# Altium footprint library lib_protel_HC_BOINA.PCBLIB: 726 footprints (part 26 of 46)
Each footprint in its own frame and in the unit in brackets; x right, y up, seen from the top. Pads: shape width x height; smd on the part's side, far side on the other; paste and mask are expansions set on the pad; w line width, h text height; cw(c..) or ccw(c..) is an arc to the next point about the centre after c.
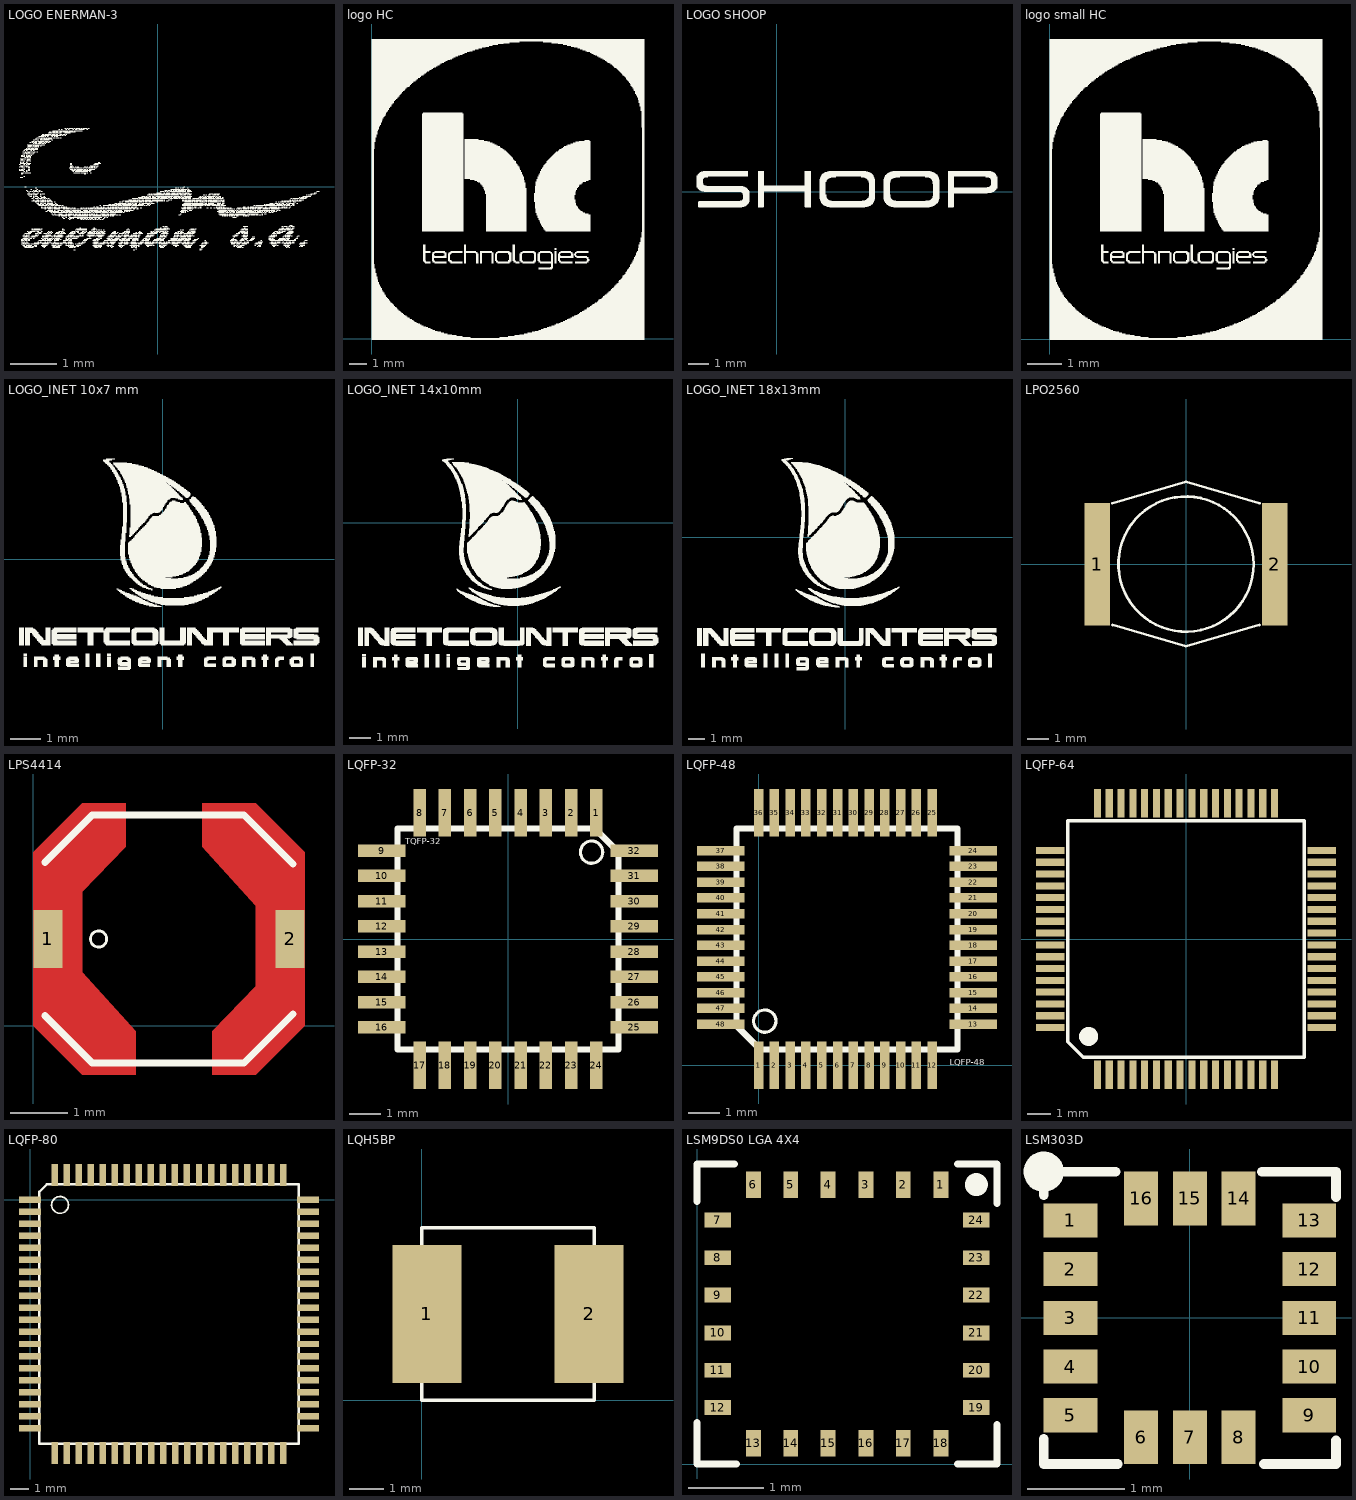
[diagram p25: the footprints below, top view; thin cyan lines are the x and y axes]

## LOGO ENERMAN-3 [mm]
Top Overlay:
  drawing of 1341 lines, arcs and shapes, not listed

## logo HC [mm] "logo de HC de 1,5x1,5mm aproximadamente"
Top Overlay:
  drawing of 1274 lines, arcs and shapes, not listed

## LOGO SHOOP [mm]
Top Overlay:
  drawing of 515 lines, arcs and shapes, not listed

## logo small HC [mm] "Logo de 7x7mm aproximadamente"
Top Overlay:
  drawing of 1274 lines, arcs and shapes, not listed

## LOGO_INET 10x7 mm [mm]
Top Overlay:
  drawing of 1271 lines, arcs and shapes, not listed

## LOGO_INET 14x10mm [mm]
Top Overlay:
  drawing of 1793 lines, arcs and shapes, not listed

## LOGO_INET 18x13mm [mm]
Top Overlay:
  drawing of 2284 lines, arcs and shapes, not listed

## LPO2560 [mm] "LPO2506 Series On board style"
height 1.65
pads (2):
  rect 1.21x5.84 smd: 1(-4.225,0) 2(4.225,0)
Top Overlay:
  circle w0.127: c0,0 r3.22
  lines w0.127: -3.506,2.895 0.001,3.915 3.501,2.905 ; -3.5,-2.9 -0.005,-3.909 3.5,-2.9

## LPS4414 [mm]
height 1.4
pads (2):
  rect 0.5x1 smd mask+0: 1(0.25,1.5) 2(4.45,1.5)
Top Layer:
  region: 0,0 0,3 0.85,3.85 1.6,3.85 1.6,3.1 0.85,2.32 0.85,0.92 1.77,-0.1 1.77,-0.85 0.85,-0.85
  region: 4.7,3 4.7,0 3.85,-0.85 3.1,-0.85 3.1,-0.1 3.85,0.68 3.85,2.08 2.93,3.1 2.93,3.85 3.85,3.85
Top Overlay:
  circle w0.051: c1.13,1.5 r0.14
  lines w0.127: 0.2,0.17 1.02,-0.65 3.65,-0.65 4.5,0.2 ; 0.2,2.83 1.02,3.65 3.65,3.65 4.5,2.8

## LQFP-32 [mm]
pads (32):
  rect 0.4x1.5 smd: 1(2.8,4) 2(2,4) 3(1.2,4) 4(0.4,4) 5(-0.4,4) 6(-1.2,4) 7(-2,4) 8(-2.8,4) 17(-2.8,-4) 18(-2,-4) 19(-1.2,-4) 20(-0.4,-4) 21(0.4,-4) 22(1.2,-4) 23(2,-4) 24(2.8,-4)
  rect 1.5x0.4 smd: 9(-4,2.8) 10(-4,2) 11(-4,1.2) 12(-4,0.4) 13(-4,-0.4) 14(-4,-1.2) 15(-4,-2) 16(-4,-2.8) 25(4,-2.8) 26(4,-2) 27(4,-1.2) 28(4,-0.4) 29(4,0.4) 30(4,1.2) 31(4,2) 32(4,2.8)
Top Overlay:
  circle w0.1: c2.646,2.75 r0.353
  lines w0.2: -3.5,-3.5 3.5,-3.5 3.5,2.75 2.75,3.5 -3.5,3.5 -3.5,-3.5
  text "TQFP-32" at -3.25,3 h0.2

## LQFP-48 [mm]
height 1.6
pads (48):
  rect 0.3x1.5 smd: 1(0,0) 2(0.5,0) 3(1,0) 4(1.5,0) 5(2,0) 6(2.5,0) 7(3,0) 8(3.5,0) 9(4,0) 10(4.5,0) 11(5,0) 12(5.5,0) 25(5.5,8) 26(5,8) 27(4.5,8) 28(4,8) 29(3.5,8) 30(3,8) 31(2.5,8) 32(2,8) 33(1.5,8) 34(1,8) 35(0.5,8) 36(0,8)
  rect 1.5x0.3 smd: 13(6.8,1.3) 14(6.8,1.8) 15(6.8,2.3) 16(6.8,2.8) 17(6.8,3.3) 18(6.8,3.8) 19(6.8,4.3) 20(6.8,4.8) 21(6.8,5.3) 22(6.8,5.8) 23(6.8,6.3) 24(6.8,6.8) 37(-1.2,6.8) 38(-1.2,6.3) 39(-1.2,5.8) 40(-1.2,5.3) 41(-1.2,4.8) 42(-1.2,4.3) 43(-1.2,3.8) 44(-1.2,3.3) 45(-1.2,2.8) 46(-1.2,2.3) 47(-1.2,1.8) 48(-1.2,1.3)
Top Overlay:
  circle w0.1: c0.196,1.4 r0.353
  lines w0.2: -0.7,1.25 0.05,0.5 6.3,0.5 6.3,7.5 -0.7,7.5 -0.7,1.25
  text "LQFP-48" at 6.05,0 h0.2
3D body "LQFP-48.stp": height 1.5, standoff 0, extent -1.75,-0.45 7.25,8.55

## LQFP-64 [mm]
pads (64):
  rect 0.3x1.2 smd: 1(-3.75,-5.75) 2(-3.25,-5.75) 3(-2.75,-5.75) 4(-2.25,-5.75) 5(-1.75,-5.75) 6(-1.25,-5.75) 7(-0.75,-5.75) 8(-0.25,-5.75) 9(0.25,-5.75) 10(0.75,-5.75) 11(1.25,-5.75) 12(1.75,-5.75) 13(2.25,-5.75) 14(2.75,-5.75) 15(3.25,-5.75) 16(3.75,-5.75) 33(3.75,5.75) 34(3.25,5.75) 35(2.75,5.75) 36(2.25,5.75) 37(1.75,5.75) 38(1.25,5.75) 39(0.75,5.75) 40(0.25,5.75) 41(-0.25,5.75) 42(-0.75,5.75) 43(-1.25,5.75) 44(-1.75,5.75) 45(-2.25,5.75) 46(-2.75,5.75) 47(-3.25,5.75) 48(-3.75,5.75)
  rect 1.2x0.3 smd: 17(5.75,-3.75) 18(5.75,-3.25) 19(5.75,-2.75) 20(5.75,-2.25) 21(5.75,-1.75) 22(5.75,-1.25) 23(5.75,-0.75) 24(5.75,-0.25) 25(5.75,0.25) 26(5.75,0.75) 27(5.75,1.25) 28(5.75,1.75) 29(5.75,2.25) 30(5.75,2.75) 31(5.75,3.25) 32(5.75,3.75) 49(-5.75,3.75) 50(-5.75,3.25) 51(-5.75,2.75) 52(-5.75,2.25) 53(-5.75,1.75) 54(-5.75,1.25) 55(-5.75,0.75) 56(-5.75,0.25) 57(-5.75,-0.25) 58(-5.75,-0.75) 59(-5.75,-1.25) 60(-5.75,-1.75) 61(-5.75,-2.25) 62(-5.75,-2.75) 63(-5.75,-3.25) 64(-5.75,-3.75)
Top Overlay:
  circle w0.4: c-4.125,-4.125 r0.202
  lines w0.15: -5,-4.35 -4.35,-5 5,-5 5,5 -5,5 -5,-4.35
3D body "LQFP-64-1.STEP": height 1.5, standoff 0, extent -4.975,-5.95 5.025,6.05

## LQFP-80 [mm]
height 1.6
pads (80):
  rect 1.2x0.35 smd: 1(0,0) 2(0,-0.65) 3(0,-1.3) 4(0,-1.95) 5(0,-2.6) 6(0,-3.25) 7(0,-3.9) 8(0,-4.55) 9(0,-5.2) 10(0,-5.85) 11(0,-6.5) 12(0,-7.15) 13(0,-7.8) 14(0,-8.45) 15(0,-9.1) 16(0,-9.75) 17(0,-10.4) 18(0,-11.05) 19(0,-11.7) 20(0,-12.35) 41(15,-12.35) 42(15,-11.7) 43(15,-11.05) 44(15,-10.4) 45(15,-9.75) 46(15,-9.1) 47(15,-8.45) 48(15,-7.8) 49(15,-7.15) 50(15,-6.5) 51(15,-5.85) 52(15,-5.2) 53(15,-4.55) 54(15,-3.9) 55(15,-3.25) 56(15,-2.6) 57(15,-1.95) 58(15,-1.3) 59(15,-0.65) 60(15,0)
  rect 0.35x1.2 smd: 21(1.33,-13.68) 22(1.98,-13.68) 23(2.63,-13.68) 24(3.28,-13.68) 25(3.93,-13.68) 26(4.58,-13.68) 27(5.23,-13.68) 28(5.88,-13.68) 29(6.53,-13.68) 30(7.18,-13.68) 31(7.83,-13.68) 32(8.48,-13.68) 33(9.13,-13.68) 34(9.78,-13.68) 35(10.43,-13.68) 36(11.08,-13.68) 37(11.73,-13.68) 38(12.38,-13.68) 39(13.03,-13.68) 40(13.68,-13.68) 61(13.67,1.32) 62(13.02,1.32) 63(12.37,1.32) 64(11.72,1.32) 65(11.07,1.32) 66(10.42,1.32) 67(9.77,1.32) 68(9.12,1.32) 69(8.47,1.32) 70(7.82,1.32) 71(7.17,1.32) 72(6.52,1.32) 73(5.87,1.32) 74(5.22,1.32) 75(4.57,1.32) 76(3.92,1.32) 77(3.27,1.32) 78(2.62,1.32) 79(1.97,1.32) 80(1.32,1.32)
Top Overlay:
  lines w0.1: 2.07,-0.29 cw(c1.617,-0.29) 2.07,-0.276
  lines w0.127: 0.5,-13.18 0.5,0.42 0.9,0.82 14.5,0.82 14.5,-13.18 0.5,-13.18

## LQH5BP [mm] "FERRITA NFC"
height 2
pads (2):
  rect 2x4 smd mask+0.05: 1(0.15,2.5) 2(4.85,2.5)
Top Overlay:
  lines w0.1: 0,0 0,5 5,5 5,0 0,0

## LSM9DS0 LGA 4X4 [mm] "LGA 4X4"
height 1
pads (24):
  rect 0.2x0.35 smd: 1(3.25,3.725) 2(2.75,3.725) 3(2.25,3.725) 4(1.75,3.725) 5(1.25,3.725) 6(0.75,3.725) 13(0.75,0.275) 14(1.25,0.275) 15(1.75,0.275) 16(2.25,0.275) 17(2.75,0.275) 18(3.25,0.275)
  rect 0.35x0.2 smd: 7(0.275,3.25) 8(0.275,2.75) 9(0.275,2.25) 10(0.275,1.75) 11(0.275,1.25) 12(0.275,0.75) 19(3.725,0.75) 20(3.725,1.25) 21(3.725,1.75) 22(3.725,2.25) 23(3.725,2.75) 24(3.725,3.25)
Top Overlay:
  circle w0.254: c3.725,3.725 r0.025
  lines w0.1: 0,0.55 0,0 0.525,0 ; 0,3.5 0,4 0.5,4 ; 3.475,0 4,0 4,0.525 ; 3.475,4 4,4 4,3.475

## LSM303D [mm] "SGTL5000"
height 0.6
pads (16):
  rect 0.55x0.35 smd mask+0.05: 1(-1.225,1) 2(-1.225,0.5) 3(-1.225,0) 4(-1.225,-0.5) 5(-1.225,-1) 9(1.225,-1) 10(1.225,-0.5) 11(1.225,0) 12(1.225,0.5) 13(1.225,1)
  rect 0.35x0.55 smd mask+0.05: 6(-0.5,-1.225) 7(0,-1.225) 8(0.5,-1.225) 14(0.5,1.225) 15(0,1.225) 16(-0.5,1.225)
Top Overlay:
  circle w0.254: c-1.5,1.5 r0.079
  lines w0.1: -1.5,-1.24 -1.5,-1.5 -0.74,-1.5 ; -1.5,1.26 -1.5,1.5 -0.76,1.5 ; 0.74,1.5 1.5,1.5 1.5,1.24 ; 0.76,-1.5 1.5,-1.5 1.5,-1.26